# Altium footprint library hphonglib.PcbLib: 1250 footprints (part 47 of 79)
Each footprint in its own frame and in the unit in brackets; x right, y up, seen from the top. Pads: shape width x height; smd on the part's side, far side on the other; paste and mask are expansions set on the pad; w line width, h text height; cw(c..) or ccw(c..) is an arc to the next point about the centre after c.
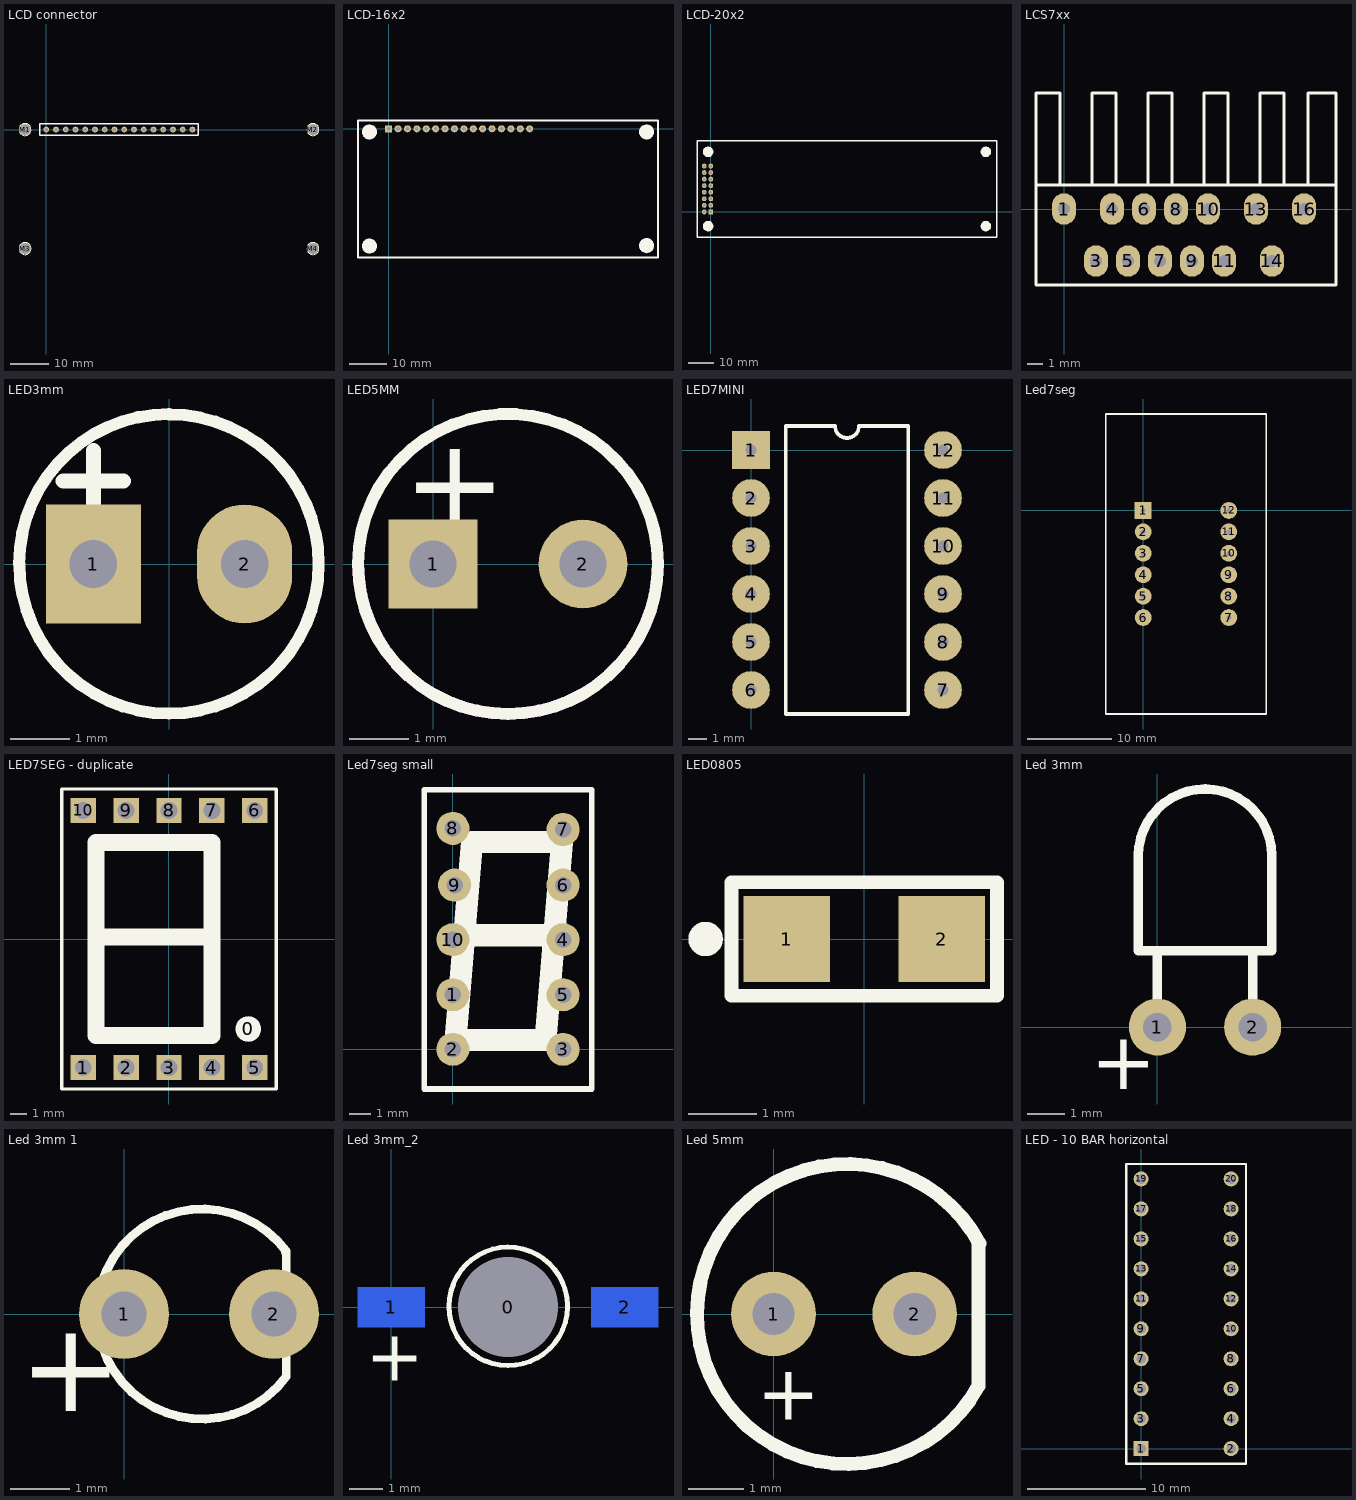
[diagram p46: the footprints below, top view; thin cyan lines are the x and y axes]

## LCD connector [mm] "Character LCD 16x2"
pads (20):
  round 1.5 hole 0.9: 1(0,0) 2(2.54,0) 3(5.08,0) 4(7.62,0) 5(10.16,0) 6(12.7,0) 7(15.24,0) 8(17.78,0) 9(20.32,0) 10(22.86,0) 11(25.4,0) 12(27.94,0) 13(30.48,0) 14(33.02,0) 15(35.56,0) 16(38.1,0)
  round 3 hole 2.5 unplated: M1(-5.5,0) M2(69.5,0) M3(-5.5,-31) M4(69.5,-31)
Top Overlay:
  circle w0.254: c-5.5,-31 r1.57
  circle w0.254: c69.5,-31 r1.57
  circle w0.254: c69.5,0 r1.57
  circle w0.254: c-5.525,0 r1.57
  lines w0.381: -1.702,-1.5 39.649,-1.5 39.649,1.55 -1.702,1.55 -1.702,-1.5
Bottom Overlay:
  circle w0.254: c69.5,0.025 r1.57
  circle w0.254: c69.5,-30.975 r1.57
  circle w0.254: c-5.5,-30.975 r1.57
  circle w0.254: c-5.5,0.025 r1.57
3D body "LCD connector.STEP": height 5.5, standoff -3.49, extent -1.27,-1.321 39.37,1.219

## LCD-16x2 [mil] "Character LCD; 16x2; Solder Pad 35mil"
pads (16):
  rect 75x75 hole 40: 1(0,0)
  round 75 hole 40: 2(100,0) 3(200,0) 4(300,0) 5(400,0) 6(500,0) 7(600,0) 8(700,0) 9(800,0) 10(900,0) 11(1000,0) 12(1100,0) 13(1200,0) 14(1300,0) 15(1400,0) 16(1500,0)
Top Overlay:
  drawing of 8 lines, arcs and shapes, not listed
3D body "User Library-LCD module 16 X 2 backlight.step": height 524, standoff 4, extent -315.14,-1358.5 2854.15,78.51

## LCD-20x2 [mil] "Character LCD; 20x2; Solder Pad 35mil"
pads (16):
  rect 75x75 hole 40: 1(0,0)
  round 75 hole 40: 2(-100,0) 3(0,100) 4(-100,100) 5(0,200) 6(-100,200) 7(0,300) 8(-100,300) 9(0,400) 10(-100,400) 11(0,500) 12(-100,500) 13(0,600) 14(-100,600) 15(0,700) 16(-100,700)
Top Overlay:
  drawing of 8 lines, arcs and shapes, not listed
3D body "User Library-LCD_20x2.step": height 524.13, standoff 0.51, extent -198.46,-378.34 4368.47,1078.35

## LCS7xx [mil] "LLC controller"
pads (13):
  oval 60x78.74 hole 30: 1(0,0) 3(80,-130) 4(120,0) 5(160,-130) 6(200,0) 7(240,-130) 8(280,0) 9(320,-130) 10(360,0) 11(400,-130) 13(480,0) 14(520,-130) 16(600,0)
Top Overlay:
  lines w7.87: -10,60 -10,290 -70,290 -70,60 ; 70,60 70,290 130,290 130,60 ; 210,60 210,290 270,290 270,60 ; 350,60 350,290 410,290 410,60 ; 490,60 490,290 550,290 550,60 ; 610,60 610,290 680,290 680,60 ; -70,60 680,60 ; -70,60 -70,-190 680,-190 680,60

## LED3mm [mm]
pads (2):
  rect 1.6x2 hole 0.8: 1(-1.27,0)
  oval 1.6x2 hole 0.8: 2(1.27,0)
Top Overlay:
  lines w0.203: -2.521,0 cw(c0,0) 0,2.521 ; -2.514,0 ccw(c0,0) 0,-2.514 ccw(c0,0) 2.514,0 ccw(c0,0) 0,2.514
  lines w0.254: -1.778,1.397 -0.762,1.397 ; -1.27,0.889 -1.27,1.905
3D body "SW3DPS-REDLED-DIP.step": height 5.38, standoff -3.17, extent -1.992,-1.499 1.992,1.994

## LED5MM [mm]
pads (2):
  rect 1.5x1.5 hole 0.8: 1(0,0)
  round 1.5 hole 0.8: 2(2.54,0)
Top Overlay:
  lines w0.203: -1.27,0 cw(c1.27,0) 3.81,0 cw(c1.27,0) 1.27,-2.54 cw(c1.27,0) -1.27,0
  text "+" at -0.508,0.635 h1.52
Mechanical 1:
  lines w0.203: -1.27,0 ccw(c1.27,0) 1.27,-2.54 ccw(c1.27,0) 3.81,0

## LED7MINI [mm] "oki"
pads (12):
  rect 2x2 / inner rect 2.5x1.2 / far side rect 2x2 hole 0.6: 1(0,0)
  round 2 / inner oval 2.5x1.2 / far side round 2 hole 0.6: 2(0,-2.54) 3(0,-5.08) 4(0,-7.62) 5(0,-10.16) 6(0,-12.7) 7(10.16,-12.7) 8(10.16,-10.16) 9(10.16,-7.62) 10(10.16,-5.08) 11(10.16,-2.54) 12(10.16,0)
Top Overlay:
  lines w0.2: 1.835,-13.97 8.325,-13.97 8.325,1.27 5.715,1.27 cw(c5.08,1.27) 4.445,1.27 1.835,1.27 1.835,-13.97

## Led7seg [mm]
pads (12):
  rect 2x2 / inner rect 2.5x1.2 / far side rect 2x2 hole 0.6: 1(0,0)
  round 2 / inner oval 2.5x1.2 / far side round 2 hole 0.6: 2(0,-2.54) 3(0,-5.08) 4(0,-7.62) 5(0,-10.16) 6(0,-12.7) 7(10.16,-12.7) 8(10.16,-10.16) 9(10.16,-7.62) 10(10.16,-5.08) 11(10.16,-2.54) 12(10.16,0)
Top Overlay:
  lines w0.2: 4.191,11.43 14.605,11.43 14.605,-24.13 -4.445,-24.13 -4.445,11.43 4.445,11.43

## LED7SEG - duplicate [mm] "LED7SEG"
pads (11):
  round 1.524 on Top Overlay: 0(4.724,-5.334)
  rect 1.5x1.5 hole 1: 1(-5.055,-7.62) 2(-2.515,-7.62) 3(0.025,-7.62) 4(2.565,-7.62) 5(5.105,-7.62) 6(5.105,7.62) 7(2.565,7.62) 8(0.025,7.62) 9(-2.515,7.62) 10(-5.055,7.62)
Top Overlay:
  lines w0.2: -6.325,-8.89 -6.325,8.89 6.375,8.89 6.375,-8.89 -6.325,-8.89
  lines w1: -4.166,0.127 2.565,0.127 ; -4.293,-5.715 2.565,-5.715 2.565,5.715 -4.293,5.715 -4.293,-5.715
3D body "SW3DPS-7SEGMENT DISPLAY.STEP": height 8.03, standoff -3.97, extent -6.35,-9.525 6.35,9.525

## Led7seg small [mil]
pads (10):
  round 60 hole 30: 1(0,99) 2(0,0) 3(200,0) 4(200,199) 5(200,99) 6(200,298) 7(200,399) 8(0,401) 9(3,298) 10(0,199)
Top Overlay:
  lines w10: 252,-72 -52,-72 -52,471 252,471 252,-69
  lines w40: 20.74,207 183.74,207 ; 5,17 168.13,17 198.04,376 34.92,376 5,17
  text "." at 220,8 h31.5
Bottom Overlay:
  lines w10: -51.18,-70.87 -51.18,472.44 250.98,472.44 250.98,-70.87 -51.18,-70.87
3D body: height 315.75, standoff 314.96, extent 202.16,-9.28 242.16,30.72
3D body: height 315.75, standoff 314.96, extent 52.17,16.73 217.52,394.69
3D body: height 315.75, standoff 314.96, extent -14.21,0.55 187.44,393.86
3D body: height 314.96, standoff 0, extent -50.2,-71.85 252.95,472.44

## LED0805 [mil] "Chip Resistor; Body 2.0 x 1.3 mm (LxW typ)"
height 100
pads (2):
  rect 50x50 smd: 1(-45,0) 2(45,0)
Top Overlay:
  circle w10: c-92,0 r5
  lines w7.87: 77,32 77,-33 -77,-33 -77,33 77,33
3D body: height 19.68, standoff 0, extent -60,-25 60,25
3D body: height 47.24, standoff 19.68, extent -35,-25 35,25

## Led 3mm [mil] "Led 3mm nam"
pads (2):
  round 60 hole 30: 1(0,0) 2(100,0)
Top Overlay:
  lines w10: 0,5 0,80 ; 100,0 100,80 ; -20,80 -20,180 cw(c50,180) 120,180 120,80 -20,80
  text "+" at -70,-65 h60
3D body: height 86.55, standoff 70.87, extent 6.89,-4.92 22.61,113.19
3D body: height 86.55, standoff 70.87, extent 77.76,-4.92 93.47,113.19
3D body: height 82.68, standoff -39.37, extent 5.92,-6.89 21.64,8.8
3D body: height 82.68, standoff -39.37, extent 77.77,-6.89 93.49,8.8
3D body: height 117.8, standoff 39.37, extent 11.06,87.6 89.64,205.71
3D body: height 118.11, standoff 39.37, extent 11.24,165.69 89.57,244.09
3D body: height 137.33, standoff 19.69, extent -8.63,75.79 109.25,115.16

## Led 3mm 1 [mil] "Led 3mm"
pads (2):
  round 60 hole 30: 1(0,0) 2(100,0)
Top Overlay:
  lines w3.94: 106.75,41.11 108.7,41.11 108.2,41.11
  lines w5.91: 108.01,42.05 ccw(c52.05,0) 108.2,-41.79 108.2,41.11
  text "+" at -70,-65 h60
3D body: height 82.68, standoff -39.37, extent 73.82,-7.87 89.54,7.81
3D body: height 82.68, standoff -39.37, extent 10.84,-7.87 26.56,7.81
3D body: height 255.91, standoff 137.8, extent -7.57,-60.52 109.93,57.09
3D body: height 196.85, standoff 78.74, extent -7.64,-60.04 110,57.84
3D body: height 98.43, standoff 59.06, extent -16.73,-70.87 108.27,69.88

## Led 3mm_2 [mm] "Led 3mm"
pads (3):
  round 2 hole 3 paste+0 mask+0: 0(3.5,0)
  rect 2x1.2 smd far side: 1(0,0) 2(7,0)
Top Overlay:
  lines w0.1: 4.896,1.07 4.945,1.07 4.933,1.07
  lines w0.15: 5.284,0.001 cw(c3.506,0.025) 5.284,0.052
  text "+" at -0.762,-2.21 h1.52
3D body: height -0.5, standoff -1.5, extent 1.895,-1.673 5.07,1.902
3D body: height 2, standoff -1, extent 2.037,-1.524 5.025,1.47
3D body: height 3.5, standoff 0.5, extent 2.064,-1.666 5.048,1.321

## Led 5mm [mil] "Led 5mm"
pads (2):
  round 60 hole 30: 1(0,0) 2(100,0)
Top Overlay:
  lines w9.84: 145.32,49.54 145.32,-50.99 cw(c52.05,0) 145.93,49.86
  text "+" at -11.81,-74.8 h39.37
3D body: height 82.68, standoff -39.37, extent 11.83,-6.89 27.54,8.8
3D body: height 82.68, standoff -39.37, extent 74.8,-6.89 90.52,8.8
3D body: height 82.68, standoff -39.37, extent -2.94,-7.87 12.78,7.81
3D body: height 98.43, standoff 59.06, extent -54.13,-106.3 145.67,106.3
3D body: height 196.85, standoff 78.74, extent -28.23,-79.41 128.63,77.76
3D body: height 275.59, standoff 118.11, extent -28.13,-80.04 128.53,76.77

## LED - 10 BAR horizontal [mil]
pads (20):
  rect 50x50 hole 32: 1(0,0)
  round 50 hole 32: 2(300,0) 3(0,100) 4(300,100) 5(0,200) 6(300,200) 7(0,300) 8(300,300) 9(0,400) 10(300,400) 11(0,500) 12(300,500) 13(0,600) 14(300,600) 15(0,700) 16(300,700) 17(0,800) 18(300,800) 19(0,900) 20(300,900)
Top Overlay:
  lines w8: -50,-50 350,-50 350,950 -50,950 -50,-50
Bottom Overlay:
  lines w10: -51.18,-51.18 349.41,-51.18 349.41,947.83 350.39,947.83 -51.18,947.83 -51.18,-51.18
3D body: height 236.61, standoff 232.28, extent 32.48,-30.91 266.73,35.04
3D body: height 236.61, standoff 232.28, extent 32.48,69.09 266.73,135.04
3D body: height 236.61, standoff 232.28, extent 32.48,169.09 266.73,235.04
3D body: height 236.61, standoff 232.28, extent 32.48,269.09 266.73,335.04
3D body: height 236.61, standoff 232.28, extent 32.48,369.09 266.73,435.04
3D body: height 236.61, standoff 232.28, extent 32.48,469.09 266.73,535.04
3D body: height 236.61, standoff 232.28, extent 32.48,569.09 266.73,635.04
3D body: height 236.61, standoff 232.28, extent 32.48,669.09 266.73,735.04
3D body: height 236.61, standoff 232.28, extent 32.48,769.09 266.73,835.04
3D body: height 236.61, standoff 232.28, extent 32.48,869.09 266.73,935.04
3D body: height 236.22, standoff 0, extent -46.89,-49.21 351.38,949.37